# Altium footprint library TO系列封装.PcbLib: 129 footprints (part 2 of 9)
Each footprint in its own frame and in the unit in brackets; x right, y up, seen from the top. Pads: shape width x height; smd on the part's side, far side on the other; paste and mask are expansions set on the pad; w line width, h text height; cw(c..) or ccw(c..) is an arc to the next point about the centre after c.
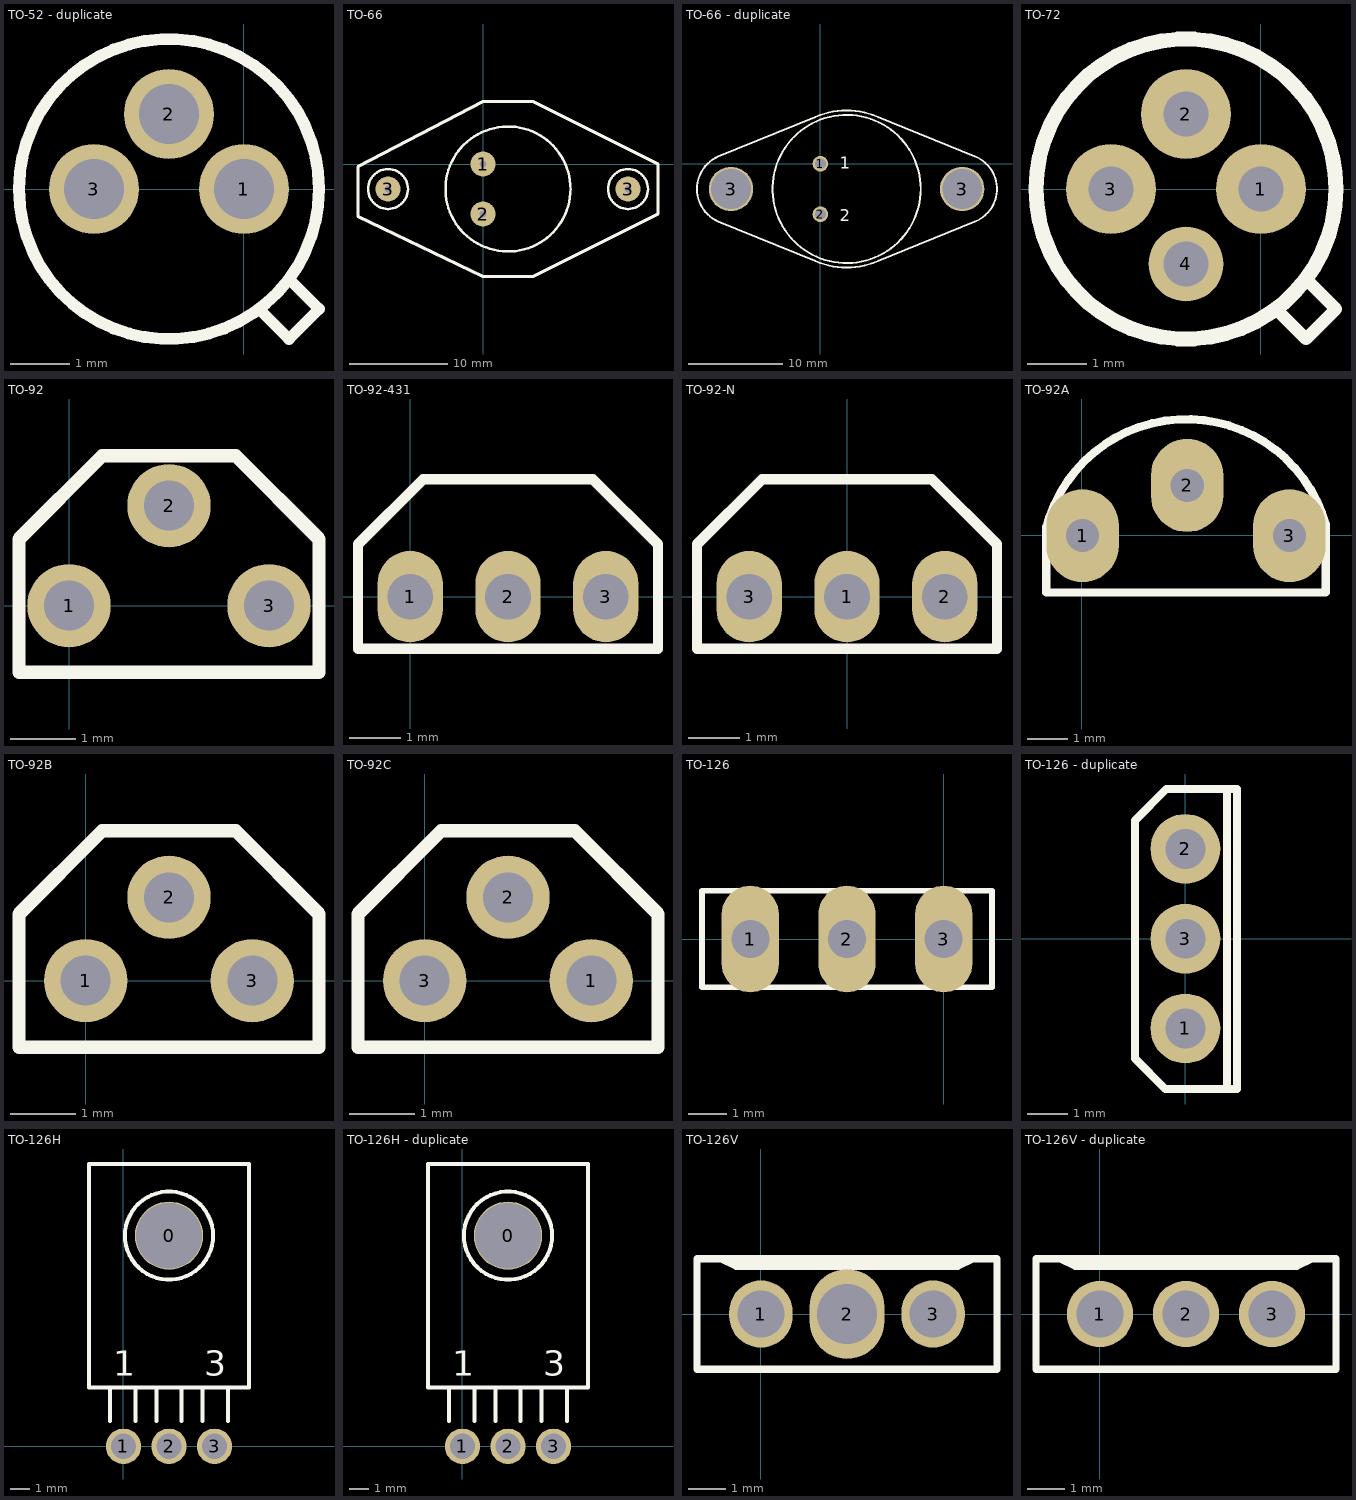
[diagram p1: the footprints below, top view; thin cyan lines are the x and y axes]

## TO-52 - duplicate [mil]
pads (3):
  round 60 hole 40: 1(0,0) 2(-50,50) 3(-100,0)
Top Overlay:
  circle w7.87: c-50,0 r100
  lines w7.87: 10,-80 30,-100 50,-80 30,-60

## TO-66 [mil]
pads (4):
  round 100 hole 28: 1(0,0) 2(0,-200) 3(-380,-100) 3(580,-100)
Top Overlay:
  circle w10: c580,-100 r80
  circle w10: c-380,-100 r80
  circle w10: c100,-100 r250
  lines w12: -500,-210 0,-450 200,-450 700,-200 700,0 200,250 0,250 -500,-10 -500,-210
3D body "SW3dPS-TO-66.STEP": height 239.11, standoff -391.82, extent -516.77,-440.3 723.59,247.71

## TO-66 - duplicate [mil]
pads (4):
  round 65 hole 45: 1(0,0) 2(0,-210)
  round 185 hole 165: 3(-372,-105) 3(590,-105)
Top Overlay:
  circle w7.87: c109,-105 r308.33
  lines w7.87: -426,-240 -21,-405 ; -425.99,-239.75 cw(c-366,-105) -425.99,29.75 ; -426,30 -21,195 ; -18.64,-405.7 ccw(c109,-105) 236.64,-405.7 ; -18.64,195.7 cw(c109,-105) 236.64,195.7 ; 239,-405 644,-240 ; 239,195 644,30 ; 643.63,-240.21 ccw(c589,-105) 643.63,30.21
  text "1" at 80,-20 h50
  text "2" at 80,-240 h50

## TO-72 [mil]
pads (4):
  round 60 hole 30: 1(0,0) 2(-50,50) 3(-100,0)
  round 50 hole 30: 4(-50,-50)
Top Overlay:
  circle w10: c-50,0 r100
  lines w8: 10,-80 30,-100 50,-80 30,-60

## TO-92 [mil]
pads (3):
  round 50 hole 30: 1(0,0) 2(60,60) 3(120,0)
Top Overlay:
  lines w8: -30,-40 150,-40 150,40 100,90 20,90 -30,40 -30,-40
3D body "micromsd_n.stp": height 269.29, standoff -118.11, extent -33.7,-52.83 144.25,81.02

## TO-92-431 [mil]
pads (3):
  oval 50x70 hole 35: 1(0,0) 2(75,0) 3(150,0)
Top Overlay:
  lines w8: -40,-40 190,-40 190,40 140,90 10,90 -40,40 -40,-40
3D body "micromsd_n.stp": height 269.29, standoff -118.11, extent -23.7,-47.83 154.25,86.02

## TO-92-N [mil]
pads (3):
  oval 50x70 hole 35: 1(0,0) 2(75,0) 3(-75,0)
Top Overlay:
  lines w8: -115,-40 115,-40 115,40 65,90 -65,90 -115,40 -115,-40
3D body "NPN TO-92 3L (2 54mm).step": height 268.7, standoff -500, extent -93.85,-51.47 93.55,91.45

## TO-92A [mil]
pads (3):
  oval 70x90 hole 32: 1(0.83,-0.5) 2(102,48) 3(200.83,-0.5)
Top Overlay:
  lines w8: -34.55,6.14 cw(c101.24,-27.93) 236,10 ; -34.17,8 -34.17,-55.5 235.83,-55.5 235.83,9.5
3D body "User Library-TO-92-5.STEP": height 268.98, standoff -47.56, extent -11.81,-56 211.81,93.61

## TO-92B [mil]
pads (3):
  round 50 hole 30: 1(0,0) 2(50,50) 3(100,0)
Top Overlay:
  lines w8: -40,-40 140,-40 140,40 90,90 10,90 -40,40 -40,-40
3D body "TO-92B.STEP": height 314.96, standoff -119.01, extent -44.49,-59.88 144.49,94.84

## TO-92C [mil]
pads (3):
  round 50 hole 30: 1(100,0) 2(50,50) 3(0,0)
Top Overlay:
  lines w8: -40,-40 140,-40 140,40 90,90 10,90 -40,40 -40,-40
3D body "TO-92B.STEP": height 314.96, standoff -119.01, extent -44.49,-59.88 144.49,94.84

## TO-126 [mm]
pads (3):
  oval 1.5x2.8 hole 1: 1(-5.08,0) 2(-2.54,0) 3(0,0)
Top Overlay:
  lines w0.15: -6.35,-1.27 -6.35,1.27 1.27,1.27 1.27,-1.27 -6.35,-1.27
3D body "User Library-KT315.step": height 6.5, standoff -4.5, extent -6.136,-1.496 1.056,1.496

## TO-126 - duplicate [mm] "BD135"
pads (3):
  round 1.75 hole 1: 1(0,-2.25) 2(0,2.25) 3(0,0)
Top Overlay:
  lines w0.2: 1.041,-3.734 1.041,3.734 ; -1.268,-3.005 -1.268,2.964 -0.48,3.752 1.295,3.752 1.295,-3.767 -0.506,-3.767 -1.268,-3.005
3D body "BD135 (TO-126 SOT32) v4.step": height 14.6, standoff -3.35, extent -1.797,-3.934 0.903,3.866

## TO-126H [mil]
pads (4):
  round 135 hole 130: 0(90,416.67)
  round 70 hole 50: 1(0,0) 2(90,0) 3(180,0)
Top Overlay:
  circle w7.87: c90,416.67 r87.19
  lines w7.87: -26.67,50 -26.67,116.67 ; 23.33,50 23.33,116.67 ; 65,50 65,116.67 ; 115,50 115,116.67 ; 156.67,50 156.67,116.67 ; 206.67,50 206.67,116.67 ; -26.67,116.67 -68.33,116.67 -68.33,558.33 248.33,558.33 248.33,116.67 -26.67,116.67
  text "3" at 160,140 h50
  text "1" at -20,140 h50
3D body "User Library-2N5194,SPNP,60V 1_5A 40W.step": height 100, standoff -62.5, extent -60,-16.34 240,578.66

## TO-126H - duplicate [mil]
pads (4):
  round 135 hole 130: 0(90,416.67)
  round 70 hole 50: 1(0,0) 2(90,0) 3(180,0)
Top Overlay:
  circle w7.87: c90,416.67 r87.19
  lines w7.87: -26.67,50 -26.67,116.67 ; 23.33,50 23.33,116.67 ; 65,50 65,116.67 ; 115,50 115,116.67 ; 156.67,50 156.67,116.67 ; 206.67,50 206.67,116.67 ; -26.67,116.67 -68.33,116.67 -68.33,558.33 248.33,558.33 248.33,116.67 -26.67,116.67
  text "3" at 160,140 h50
  text "1" at -20,140 h50
3D body "TO-126.STEP": height 49.21, standoff -78.74, extent -69.96,-73.9 245,563.9

## TO-126V [mm]
pads (3):
  oval 1.7x1.8 hole 1.27: 1(0,0) 3(4.614,0)
  oval 2x2.4 hole 1.6: 2(2.307,0)
Top Overlay:
  lines w0.2: -1.079,1.482 -0.656,1.282 5.27,1.282 5.694,1.482 ; -1.714,-1.482 -1.714,1.482 6.329,1.482 6.329,-1.482 -1.714,-1.482
3D body "SW3dPS-TO-126.STEP": height 10.94, standoff -16.86, extent -1.695,-1.935 6.305,1.315

## TO-126V - duplicate [mil]
pads (3):
  round 70 hole 50: 1(0,0) 2(90.83,0) 3(181.67,0)
Top Overlay:
  lines w7.87: -42.5,58.33 -25.83,50.46 207.5,50.46 224.17,58.33 ; -67.5,-58.33 -67.5,58.33 249.17,58.33 249.17,-58.33 -67.5,-58.33
3D body "TO-126.STEP": height 559.06, standoff -78.74, extent -64.96,-67.95 250,60